# Altium footprint library Custom2.PcbLib: 99 footprints (part 7 of 7)
Each footprint in its own frame and in the unit in brackets; x right, y up, seen from the top. Pads: shape width x height; smd on the part's side, far side on the other; paste and mask are expansions set on the pad; w line width, h text height; cw(c..) or ccw(c..) is an arc to the next point about the centre after c.
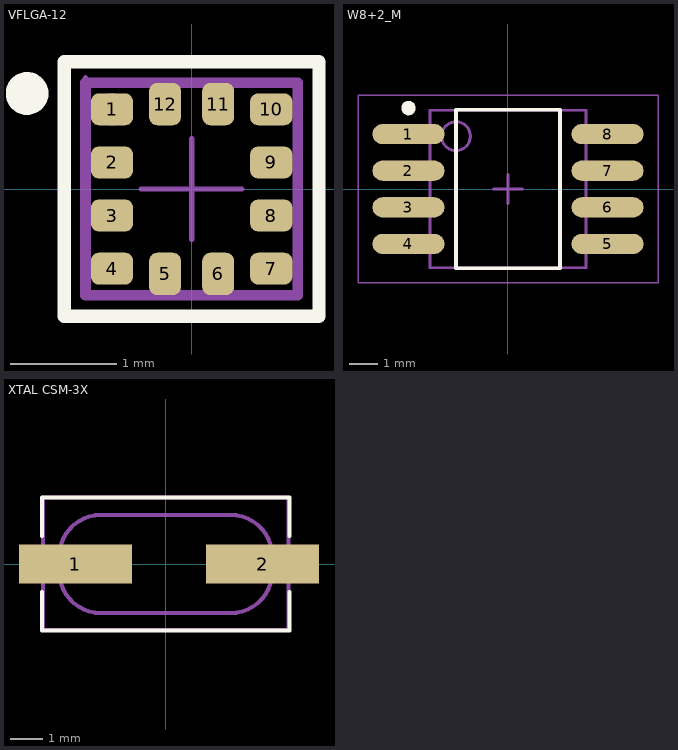
[diagram p6: the footprints below, top view; thin cyan lines are the x and y axes]

## VFLGA-12 [mm]
pads (12):
  rrect50% 0.4x0.3 smd mask+0.05: 1(-0.75,0.75) 2(-0.75,0.25) 3(-0.75,-0.25) 4(-0.75,-0.75) 7(0.75,-0.75) 8(0.75,-0.25) 9(0.75,0.25) 10(0.75,0.75)
  rrect50% 0.3x0.4 smd mask+0.05: 5(-0.25,-0.8) 6(0.25,-0.8) 11(0.25,0.8) 12(-0.25,0.8)
Top Overlay:
  circle w0.25: c-1.55,0.9 r0.076
  lines w0.127: -1.2,-1.2 -1.2,1.2 1.2,1.2 1.2,-1.2 -1.2,-1.2
Mechanical 13:
  circle w0.127: c-0.75,0.75 r0.089
  lines w0.1: -1,-1 -1,1 1,1 1,-1 -1,-1
  text "'.Designator'" at -1.219,1.397 h0.76
Mechanical 15:
  lines w0.05: -1,1 1,1 1,-1 -1,-1 -1,1.05 ; -0.475,0 0.475,0 ; 0,-0.475 0,0.475
3D body: height 1, standoff 0, extent -1.02,-1 0.98,1
3D body: height 1.1, standoff 1.08, extent -0.813,0.307 -0.306,0.813

## W8+2_M [mm]
pads (8):
  oval 2.5x0.7 smd: 1(-3.45,1.905) 2(-3.45,0.635) 3(-3.45,-0.635) 4(-3.45,-1.905) 5(3.45,-1.905) 6(3.45,-0.635) 7(3.45,0.635) 8(3.45,1.905)
Top Overlay:
  circle w0.25: c-3.45,2.805 r0.125
  lines w0.127: -1.8,-2.75 1.8,-2.75 1.8,2.75 -1.8,2.75 -1.8,-2.75
Mechanical 13:
  circle w0.1: c-1.805,1.83 r0.5
  lines w0.1: -2.705,-2.73 2.705,-2.73 2.705,2.73 -2.705,2.73 -2.705,-2.73
  text "'.Designator'" at -0.864,0 h0.76
Mechanical 15:
  lines w0.05: -5.2,-3.25 5.2,-3.25 5.2,3.25 -5.2,3.25 -5.2,-3.25
  lines w0.1: -0.5,0 0.5,0 ; 0,-0.5 0,0.5
3D body "sop-8.step": height 1.6, standoff 0, extent -3.021,-2.51 3.021,2.51

## XTAL CSM-3X [mm]
pads (2):
  rect 3.5x1.2 smd: 1(-2.8,0) 2(3,0)
Top Overlay:
  lines w0.127: -3.835,-0.864 -3.835,-2.057 3.81,-2.057 ; -3.835,0.864 -3.835,2.057 3.81,2.057 ; 3.835,-2.057 3.835,-0.864 ; 3.835,0.864 3.835,2.057
Mechanical 13:
  lines w0.127: 3.81,2.057 -3.8,2.057 -3.8,-2.043 3.8,-2.043 3.81,-2.033 3.81,2.057 ; 3.81,2.057 3.81,2.057 ; -3.302,-0.229 ccw(c-2.007,-0.229) -2.007,-1.524 0,-1.524 2.007,-1.524 ccw(c2.007,-0.229) 3.302,-0.229 3.302,0 3.302,0.229 ccw(c2.007,0.229) 2.007,1.524 0,1.524 -2.007,1.524 ccw(c-2.007,0.229) -3.302,0.229 -3.302,0 -3.302,-0.229
  text "'.Designator'" at 0.305,0.61 h0.76
3D body "CSM-3X.STEP": height 2.3, standoff 0, extent -3.8,-2.043 3.8,2.057